# Altium footprint library Components.PcbLib: 12 footprints
Each footprint in its own frame and in the unit in brackets; x right, y up, seen from the top. Pads: shape width x height; smd on the part's side, far side on the other; paste and mask are expansions set on the pad; w line width, h text height; cw(c..) or ccw(c..) is an arc to the next point about the centre after c.
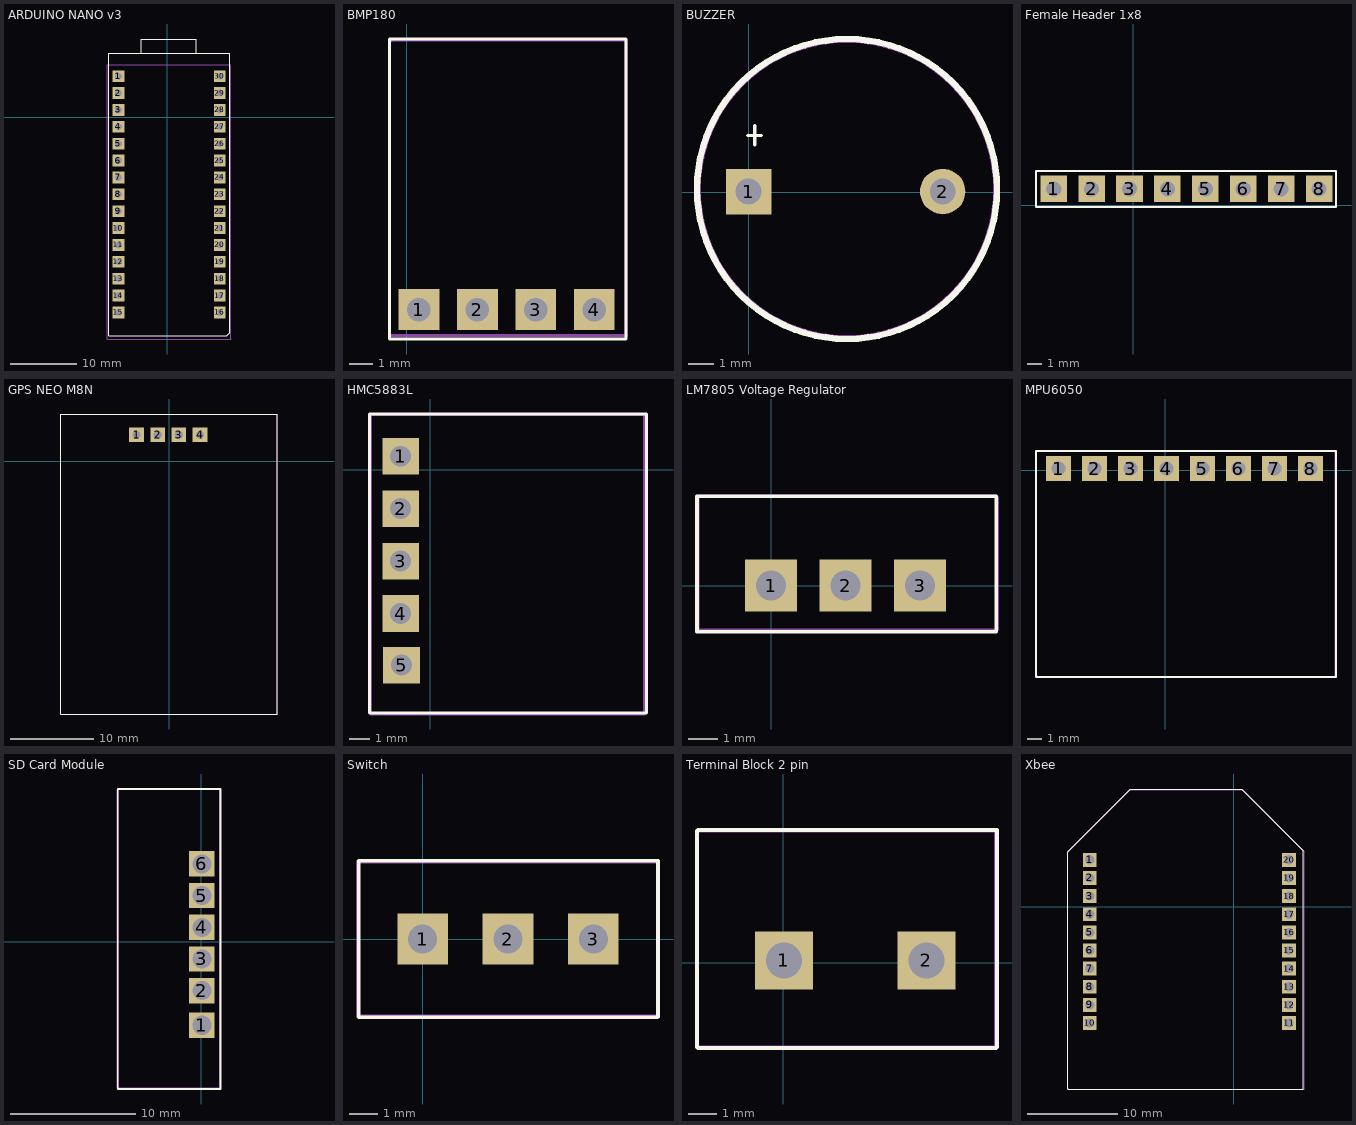
[diagram p0: the footprints below, top view; thin cyan lines are the x and y axes]

## ARDUINO NANO v3 [mil] "Arduino Nano v3"
pads (30):
  rect 70x70 hole 40: 1(-288.39,243.5) 2(-288.39,143.5) 3(-288.39,43.5) 4(-288.39,-56.5) 5(-288.39,-156.5) 6(-288.39,-256.5) 7(-288.39,-356.5) 8(-288.39,-456.5) 9(-288.39,-556.5) 10(-288.39,-656.5) 11(-288.39,-756.5) 12(-288.39,-856.5) 13(-288.39,-956.5) 14(-288.39,-1056.5) 15(-288.39,-1156.5) 16(311.61,-1156.5) 17(311.61,-1056.5) 18(311.61,-956.5) 19(311.61,-856.5) 20(311.61,-756.5) 21(311.61,-656.5) 22(311.61,-556.5) 23(311.61,-456.5) 24(311.61,-356.5) 25(311.61,-256.5) 26(311.61,-156.5) 27(311.61,-56.5) 28(311.61,43.5) 29(311.61,143.5) 30(311.61,243.5)
Top Overlay:
  lines w5: -153,381 -153,464 173,464 173,381 ; -347,-1295 354,-1295 371.06,-1277.94 371.06,380 -347,380 -347,-1295
Mechanical 1:
  lines w5: -356,-1314 378,-1314 376,-1312 376,312 230,312 81.75,312 -200.75,312 -356,312 -356,-1295 -356,-1311 -356,-1314
3D body "female_header_1x15.stp": height 334.65, standoff -125.98, extent 261.57,-1207.92 360,301.92
3D body "female_header_1x15.stp": height 334.65, standoff -125.98, extent -344,-1211 -245.57,298.84
3D body "User Library-Nano-1.STEP": height 849.68, standoff 118.82, extent -347.39,-1305 353,463.5

## BMP180 [mil] "BMP180 PCB"
pads (4):
  rect 70x70 hole 40: 1(21,181) 2(121,181) 3(221,181) 4(321,181)
Top Overlay:
  lines w5: -29,130.91 -29,644 375,644 375,130.91 -29,130.91
Mechanical 1:
  lines w5: -29,138 -29,638 -25,642 375,642 375,138 376,137 -28,137
3D body "BMP180 Breakout.step": height 572.49, standoff 102.49, extent -26.79,136.03 374.79,639.97
3D body "female_header_1x4.stp": height 334.65, standoff -125.98, extent -30.92,135 378.92,233.42

## BUZZER [mil]
pads (2):
  rect 70x70 hole 40: 1(0,0.98)
  round 70 hole 40: 2(299.21,0.98)
Top Overlay:
  circle w10: c151.57,4.92 r231.3
  lines w5: -1.97,87.6 9.35,87.6 19.68,87.6 ; 9.35,72.83 9.35,102.36
Mechanical 1:
  circle w10: c151.57,4.92 r230.35
3D body "buzzer.stp": height 374.02, standoff -216.54, extent -80.71,-233.27 391.73,239.17

## Female Header 1x8 [mil] "Female Header 1x8"
pads (8):
  rect 70x70 hole 40: 1(-209.23,43.59) 2(-109.23,43.59) 3(-9.23,43.59) 4(90.77,43.59) 5(190.77,43.59) 6(290.77,43.59) 7(390.77,43.59) 8(490.77,43.59)
Top Overlay:
  lines w5: -255.91,-3.94 535.43,-3.94 535.43,90.55 -255.91,90.55 -255.91,-3.94
3D body "female_header_1x8.stp": height 334.65, standoff -125.98, extent -264.57,-4.92 545.28,93.5

## GPS NEO M8N [mil] "GPS NEO M8N"
pads (4):
  rect 70x70 hole 40: 1(-153.54,125.98) 2(-53.54,125.98) 3(46.46,125.98) 4(146.46,125.98)
Top Overlay:
  lines w5: -511.81,-1192.91 511.81,-1192.91 511.81,224.41 -511.81,224.41 -511.81,-1192.91
Mechanical 1:
  lines w5: -511.81,-1192.91 -511.81,-1181.1 -511.81,224.41 511.81,224.41 511.81,-1192.91 -511.81,-1192.91
3D body "female_header_1x4.stp": height 334.65, standoff -125.98, extent -216.93,80.71 192.91,179.13
3D body "male_header_1x4.STEP": height 570.87, standoff 70.87, extent -203.15,81.1 196.85,181.1
3D body "NEO-M8N.step": height 521.65, standoff 92.52, extent -509.45,-1190.95 507.87,222.44

## HMC5883L [mil]
pads (5):
  rect 70x70 hole 40: 1(-56.54,25.43) 2(-56.54,-74.57) 3(-56.54,-174.57) 4(-56.54,-274.57) 5(-55,-373)
Top Overlay:
  lines w5: -116,-464 -116,106 412,106 412,-464 -116,-464
Mechanical 1:
  lines w5: -114,-466 -114,105 408,105 408,-466 406,-466 -114,-466
3D body "female_header_1x5.stp": height 334.65, standoff -125.98, extent -105.76,-429.49 -7.33,80.36
3D body "male_header_1x5.stp": height 551.18, standoff 110.24, extent -105.59,-420.62 -7.23,79.37
3D body "GY-271 HMC5883L Triple 3 Axis Digital Compass.step": height 535.43, standoff 421.26, extent -116,-464.43 415.49,106.43

## LM7805 Voltage Regulator [mil] "LM7805 5V Voltage Regulator DIP"
pads (3):
  rect 70x70 hole 40: 1(0,0) 2(100,0) 3(200,0)
Top Overlay:
  lines w5: -99.41,-62.01 -99.41,120.08 302.17,120.08 302.17,-62.01 -99.41,-62.01
Mechanical 1:
  lines w5: -98.43,-60.04 302.17,-60.04 303.15,-59.06 303.15,118.11 301.18,120.08 -98.43,120.08 -98.43,-60.04
3D body "lm7805ct.stp": height 737.79, standoff -395.35, extent -98.62,-59.92 301.38,120.08

## MPU6050 [mil] "Female Header 1x8"
pads (8):
  rect 70x70 hole 40: 1(-296.57,5.41) 2(-196.57,5.41) 3(-96.57,5.41) 4(3.43,5.41) 5(103.43,5.41) 6(203.43,5.41) 7(303.43,5.41) 8(403.43,5.41)
Top Overlay:
  lines w5: -359.14,-573.82 -142.68,-573.82 259.25,-573.82 474.41,-573.82 474.41,53.95 -359.14,53.95 -359.14,-573.82
Mechanical 1:
  lines w5: -358.27,54.13 -358.27,-568.9 -353.35,-573.82 472.44,-573.82 473.43,-572.83 473.43,53.15 472.44,54.13
3D body "female_header_1x8.stp": height 334.65, standoff -125.98, extent -351.18,-47.24 458.66,51.18
3D body "User Library-MPU 6050 IMU.STEP": height 548.93, standoff 108.93, extent -358.41,-571.85 472.59,53.15

## SD Card Module [mil]
pads (6):
  rect 80x80 hole 60: 1(2,-264) 2(2,-155) 3(2,-55) 4(2,45) 5(2,145) 6(2,245)
Top Overlay:
  lines w5: -263,-465 61,-465 61,481 -263,481 -263,-465
Mechanical 1:
  lines w5: -264,-463 -264,480 59,480 59,-463 -264,-463
3D body "MicroSD Reader Assembly.stp": height 1885.75, standoff 39.29, extent -245.89,-467.88 17.89,477
3D body "female_header_1x6.stp": height 334.65, standoff -125.98, extent -47.43,-321.92 51,287.92

## Switch [mil] "Slide Switch"
pads (3):
  rect 70x70 hole 40: 1(0,0) 2(118.11,0) 3(236.22,0)
Top Overlay:
  lines w5: -88.58,-108.27 -88.58,108.27 325.79,108.27 325.79,-107.28 324.8,-108.27 -88.58,-108.27
Mechanical 1:
  lines w5: -89.57,-107.28 -89.57,107.28 325.79,107.28 325.79,-107.28 -89.57,-107.28
3D body "slide switch.step": height 417.29, standoff -157.48, extent -88.58,-108.26 324.81,108.28

## Terminal Block 2 pin [mil] "Terminal Block 2 pin (5mm)"
pads (2):
  rect 80x80 hole 50: 1(0.98,2.95) 2(197.83,2.95)
Top Overlay:
  lines w5: -119.09,182.09 -119.09,-117.13 -118.11,-118.11 294.29,-118.11 295.28,-117.13 295.28,182.09 295.28,183.07 -118.11,183.07
Mechanical 1:
  lines w5: -119.09,-117.13 -119.09,182.09 293.31,182.09 293.31,-118.11 292.32,-117.13 -119.09,-117.13
3D body "terminal block 2pin.STEP": height 393.7, standoff -153.47, extent -120.08,-117.13 297.24,182.09

## Xbee [mil]
pads (20):
  rect 60x60 hole 40: 1(-624.84,204.04) 2(-624.84,125.3) 3(-624.84,46.56) 4(-624.84,-32.18) 5(-624.84,-110.92) 6(-624.84,-189.66) 7(-624.84,-268.4) 8(-624.84,-347.14) 9(-624.84,-425.88) 10(-624.84,-504.62) 11(241.3,-504.62) 12(241.3,-425.88) 13(241.3,-347.14) 14(241.3,-268.4) 15(241.3,-189.66) 16(241.3,-110.92) 17(241.3,-32.18) 18(241.3,46.56) 19(241.3,125.3) 20(241.3,204.04)
Top Overlay:
  lines w5: -720.47,-791.34 303.15,-791.34 303.15,244.09 35.43,511.81 -448.82,511.81 -720.47,240.16 -720.47,-791.34 ; -720.47,-791.34 -720.47,-791.34
Mechanical 1:
  lines w5: -720.47,-791.34 307.09,-791.34 307.09,240.16 39.37,507.87 -448.82,507.87 -720.47,236.22 -720.47,-791.34 ; -720.47,-791.34 -720.47,-791.34
3D body "female_header_1x10(2mm pitch).stp": height 157.48, standoff -110.24, extent 188.98,-555.12 287.4,251.97
3D body "female_header_1x10(2mm pitch).stp": height 157.48, standoff -110.24, extent -673.23,-557.09 -574.8,250
3D body "User Library-XBeeProS1-1.step": height 688.82, standoff 37.01, extent -661.42,-790.16 272.83,506.69